# Altium footprint library CommonFootprints_V1.PcbLib: 80 footprints (part 1 of 5)
Each footprint in its own frame and in the unit in brackets; x right, y up, seen from the top. Pads: shape width x height; smd on the part's side, far side on the other; paste and mask are expansions set on the pad; w line width, h text height; cw(c..) or ccw(c..) is an arc to the next point about the centre after c.
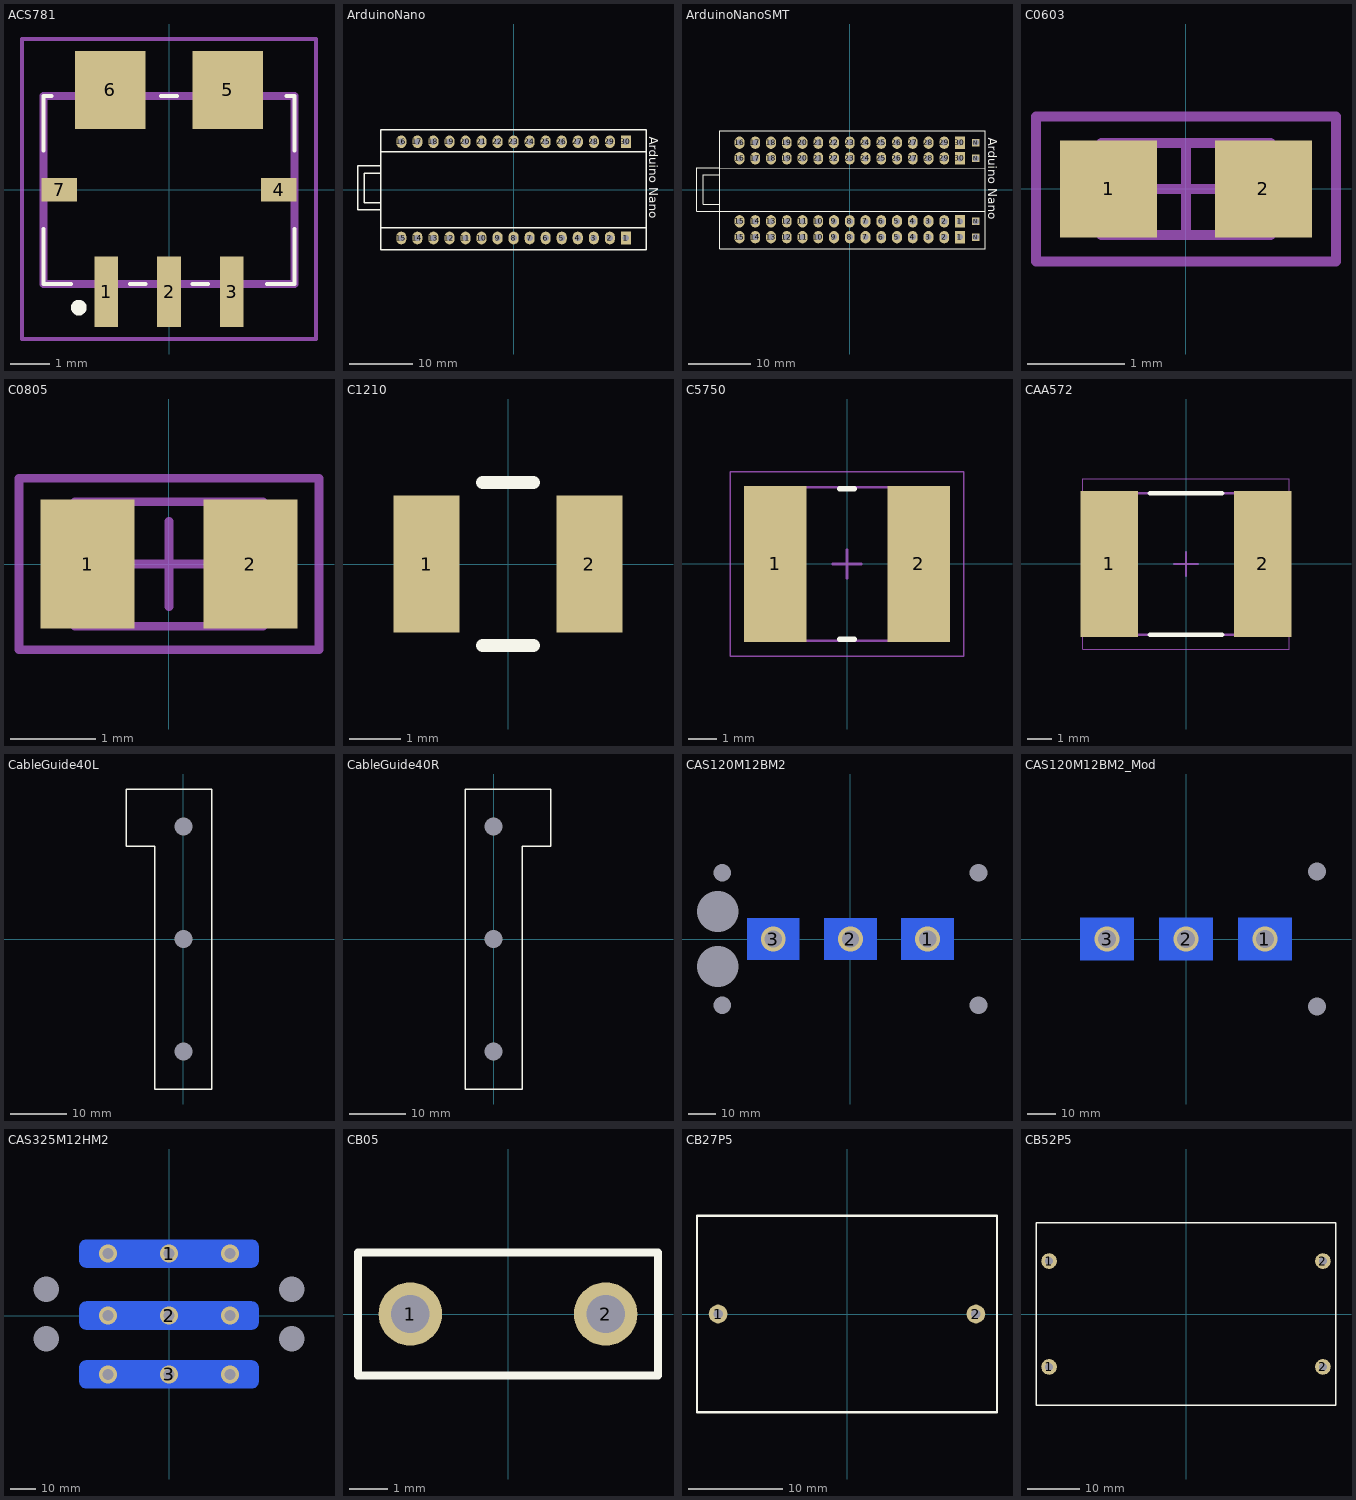
[diagram p0: the footprints below, top view; thin cyan lines are the x and y axes]

## ACS781 [mm]
pads (7):
  rect 0.6x1.8 smd: 1(-1.6,-2.6) 2(0,-2.6) 3(1.6,-2.6)
  rect 0.9x0.6 smd: 4(2.8,0) 7(-2.8,0)
  rect 1.8x2 smd: 5(1.5,2.55) 6(-1.5,2.55)
Top Overlay:
  lines w0.1: -3.2,-1 -3.2,-2.4 -2.5,-2.4 ; -3.2,1 -3.2,2.4 -3,2.4 ; -1,-2.4 -0.6,-2.4 ; -0.2,2.4 0.2,2.4 ; 0.6,-2.4 1,-2.4 ; 2.5,-2.4 3.2,-2.4 3.2,-1 ; 3,2.4 3.2,2.4 3.2,1
  lines w0.2: -2.3,-3.1 ccw(c-2.3,-3) -2.3,-2.9 ccw(c-2.3,-3) -2.3,-3.1
Mechanical 13:
  lines w0.2: -3.2,-2.4 -3.2,2.4 3.2,2.4 3.2,-2.4 -3.2,-2.4
Mechanical 15:
  lines w0.1: -3.75,-3.8 -3.75,3.85 3.75,3.85 3.75,-3.8 -3.75,-3.8
3D body "ACS781LLRTR-050U-T.stp": height 1.6, standoff 0, extent -3.2,-2.4 3.2,2.4

## ArduinoNano [mm]
pads (30):
  rect 1.6x2 hole 1: 1(17.78,-7.62) 30(17.78,7.62)
  oval 1.6x2 hole 1: 2(15.24,-7.62) 3(12.7,-7.62) 4(10.16,-7.62) 5(7.62,-7.62) 6(5.08,-7.62) 7(2.54,-7.62) 8(0,-7.62) 9(-2.54,-7.62) 10(-5.08,-7.62) 11(-7.62,-7.62) 12(-10.16,-7.62) 13(-12.7,-7.62) 14(-15.24,-7.62) 15(-17.78,-7.62) 16(-17.78,7.62) 17(-15.24,7.62) 18(-12.7,7.62) 19(-10.16,7.62) 20(-7.62,7.62) 21(-5.08,7.62) 22(-2.54,7.62) 23(0,7.62) 24(2.54,7.62) 25(5.08,7.62) 26(7.62,7.62) 27(10.16,7.62) 28(12.7,7.62) 29(15.24,7.62)
Top Overlay:
  lines w0.2: -21.082,-3.175 -24.638,-3.175 -24.638,3.81 -21.082,3.81 ; -21.082,-2.032 -23.622,-2.032 -23.622,2.667 -21.082,2.667 ; -21,-6 21,-6 ; -21,6 21,6 ; -21,-9.5 -21,9.5 21,9.5 21,-9.5 -21,-9.5
  text "Arduino Nano" at 21.463,8.382 h1.4

## ArduinoNanoSMT [mm]
pads (64):
  rect 1.6x2 hole 1: 1(17.78,-7.62) 1(17.78,-5.08) 30(17.78,5.08) 30(17.78,7.62)
  oval 1.6x2 hole 1: 2(15.24,-7.62) 2(15.24,-5.08) 3(12.7,-7.62) 3(12.7,-5.08) 4(10.16,-7.62) 4(10.16,-5.08) 5(7.62,-7.62) 5(7.62,-5.08) 6(5.08,-7.62) 6(5.08,-5.08) 7(2.54,-7.62) 7(2.54,-5.08) 8(0,-7.62) 8(0,-5.08) 9(-2.54,-7.62) 9(-2.54,-5.08) 10(-5.08,-7.62) 10(-5.08,-5.08) 11(-7.62,-7.62) 11(-7.62,-5.08) 12(-10.16,-7.62) 12(-10.16,-5.08) 13(-12.7,-7.62) 13(-12.7,-5.08) 14(-15.24,-7.62) 14(-15.24,-5.08) 15(-17.78,-7.62) 15(-17.78,-5.08) 16(-17.78,5.08) 16(-17.78,7.62) 17(-15.24,5.08) 17(-15.24,7.62) 18(-12.7,5.08) 18(-12.7,7.62) 19(-10.16,5.08) 19(-10.16,7.62) 20(-7.62,5.08) 20(-7.62,7.62) 21(-5.08,5.08) 21(-5.08,7.62) 22(-2.54,5.08) 22(-2.54,7.62) 23(0,5.08) 23(0,7.62) 24(2.54,5.08) 24(2.54,7.62) 25(5.08,5.08) 25(5.08,7.62) 26(7.62,5.08) 26(7.62,7.62) 27(10.16,5.08) 27(10.16,7.62) 28(12.7,5.08) 28(12.7,7.62) 29(15.24,5.08) 29(15.24,7.62)
  rect 1.2x1.2 hole 1: N(20.32,-7.62) N(20.32,-5.08) N(20.32,5.08) N(20.32,7.62)
Top Overlay:
  lines w0.2: -21.082,-3.429 -24.638,-3.429 -24.638,3.556 -21.082,3.556 ; -21.082,-2.286 -23.622,-2.286 -23.622,2.413 -21.082,2.413 ; -21,-3.46 21.844,-3.46 ; -21,3.556 21.889,3.46 ; -21,-9.5 21.889,-9.5 21.889,9.5 -21,9.5 -21,-9.5
  text "Arduino Nano" at 22.352,8.382 h1.4
3D body "arduino nano.STEP": height 14.3, standoff -4.3, extent -23.389,-8.89 21.611,9.11

## C0603 [mm]
pads (2):
  rect 1x1 smd: 1(-0.8,0) 2(0.8,0)
Mechanical 13:
  lines w0.1: -0.875,-0.475 0.875,-0.475 0.875,0.475 -0.875,0.475 -0.875,-0.475
Mechanical 15:
  lines w0.1: -0.475,0 0.475,0 ; 0,-0.475 0,0.475 ; -1.55,-0.75 1.55,-0.75 1.55,0.75 -1.55,0.75 -1.55,-0.75
3D body: height 0.85, standoff 0, extent -0.875,-0.475 0.875,0.475

## C0805 [mm]
pads (2):
  rect 1.1x1.5 smd: 1(-0.95,0) 2(0.95,0)
Mechanical 13:
  lines w0.1: -1.1,-0.725 1.1,-0.725 1.1,0.725 -1.1,0.725 -1.1,-0.725
Mechanical 15:
  lines w0.1: -0.5,0 0.5,0 ; 0,-0.5 0,0.5 ; -1.75,-1 1.75,-1 1.75,1 -1.75,1 -1.75,-1
3D body: height 1.1, standoff 0, extent -1.1,-0.725 1.1,0.725

## C1210 [mm]
pads (2):
  rect 1.3x2.7 smd: 1(-1.6,0) 2(1.6,0)
Top Overlay:
  lines w0.254: -0.5,-1.6 0.5,-1.6 ; -0.5,1.6 0.5,1.6
3D body "STL@%STL@%STL@%CAP_3225.stp": height 1.24, standoff 0, extent -1.803,-1.397 1.803,1.397

## C5750 [mm] "C5750 footprint"
height 3.2
pads (2):
  rect 2.2x5.5 smd: 1(-2.525,0) 2(2.525,0)
Top Overlay:
  lines w0.2: -0.25,-2.65 0.25,-2.65 ; -0.25,2.65 0.25,2.65
Mechanical 13:
  lines w0.1: -3.05,-2.7 3.05,-2.7 3.05,2.7 -3.05,2.7 -3.05,-2.7
Mechanical 15:
  lines w0.05: -4.1,-3.25 4.1,-3.25 4.1,3.25 -4.1,3.25 -4.1,-3.25
  lines w0.1: -0.5,0 0.5,0 ; 0,-0.5 0,0.5
3D body: height 3.2, standoff 0, extent 1.55,-2.7 3.05,2.7
3D body: height 3.2, standoff 0, extent -3.05,-2.7 -1.55,2.7
3D body: height 3.2, standoff 0, extent -1.55,-2.7 1.55,2.7

## CAA572 [mm] "Chip Capacitor, 2-Leads, Body 6.25x5.75mm, IPC Low Density"
height 6.7
pads (2):
  rect 2.4x6.1 smd: 1(-3.2,0) 2(3.2,0)
Top Overlay:
  lines w0.2: -1.5,-2.95 1.5,-2.95 ; -1.5,2.95 1.5,2.95
Mechanical 13:
  lines w0.1: -3.2,-2.95 3.2,-2.95 3.2,2.95 -3.2,2.95 -3.2,-2.95
Mechanical 15:
  lines w0.05: -4.3,-3.55 4.3,-3.55 4.3,3.55 -4.3,3.55 -4.3,-3.55
  lines w0.1: -0.5,0 0.5,0 ; 0,-0.5 0,0.5
3D body: height 6.7, standoff 0, extent 1.95,-2.95 3.2,2.95
3D body: height 6.7, standoff 0, extent -3.2,-2.95 -1.95,2.95
3D body: height 6.7, standoff 0, extent -1.95,-2.95 1.95,2.95

## CableGuide40L [mil]
pads (3):
  round 60 hole 125.98: 12(0,-787.4) 13(0,787.4) 14(0,0)
Top Overlay:
  lines w10: -400,650 -400,1050 200,1050 200,-1050 -200,-1050 -200,650 -400,650
3D body: height 393.7, standoff 0, extent -400,-1050 200,1050

## CableGuide40R [mil]
pads (3):
  round 60 hole 125.98: 12(0,-787.4) 13(0,787.4) 14(0,0)
Top Overlay:
  lines w10: -200,-1050 -200,1050 400,1050 400,650 200,650 200,-1050 -200,-1050
3D body: height 393.7, standoff 0, extent -200,-1050 400,1050

## CAS120M12BM2 [mm]
pads (9):
  rect 19x15 smd far side: 1(28,0) 2(0,0) 3(-28,0)
  round 1.524 hole 6.4 unplated: 4(-46.5,-24) 4(-46.5,24) 4(46.5,-24) 4(46.5,24)
  rect 1.524x1.524 hole 15 square unplated: 5(-48.2,-10) 5(-48.2,10)
via 28,0 diameter 9 hole 6.3
via 0,0 diameter 9 hole 6.3
via -28,0 diameter 9 hole 6.3
Bottom Overlay:
  lines w0.254: -53.2,-18 -42.7,-18 -42.7,-2 -53.2,-2 ; -53.2,2 -42.7,2 -42.7,18 -53.2,18 ; -53.2,-30.7 -53.2,30.7 53.2,30.7 53.2,-30.7 -53.2,-30.7
3D body "Semikron SKM SEMITRANS 3.step": height 31.29, standoff 0.79, extent -53.7,-31.285 53.7,31.115

## CAS120M12BM2_Mod [mm]
pads (5):
  rect 19x15 smd far side: 1(28,0) 2(0,0) 3(-28,0)
  round 1.524 hole 6.4 unplated: 4(46.5,-24) 4(46.5,24)
via 28,0 diameter 9 hole 6.3
via 0,0 diameter 9 hole 6.3
via -28,0 diameter 9 hole 6.3
Bottom Overlay:
  lines w0.254: -53.2,-18 -42.7,-18 -42.7,-2 -53.2,-2 ; -53.2,2 -42.7,2 -42.7,18 -53.2,18 ; -53.2,-30.7 -53.2,30.7 53.2,30.7 53.2,-30.7 -53.2,-30.7
3D body "Semikron SKM SEMITRANS 3.step": height 31.29, standoff 0.79, extent -53.7,-31.285 53.7,31.115

## CAS325M12HM2 [mil]
pads (7):
  rrect50% 2755.91x433.07 smd far side: 1(0,952.76) 2(0,0) 3(0,-905.51)
  rect 60x60 hole 393.7 square unplated: 5(-1890,-360) 5(-1890,405) 5(1890,-360) 5(1890,405)
via 937.01,0 diameter 275.59 hole 173.23
via -937.01,0 diameter 275.59 hole 173.23
via 0,0 diameter 275.59 hole 173.23
via 0,952.76 diameter 275.59 hole 173.23
via 937.01,952.76 diameter 275.59 hole 173.23
via 0,-905.51 diameter 275.59 hole 173.23
via 937.01,-905.51 diameter 275.59 hole 173.23
via -937.01,-905.51 diameter 275.59 hole 173.23
via -937.01,952.76 diameter 275.59 hole 173.23
Bottom Overlay:
  circle w10: c1830.71,964.57 r216.54
  circle w10: c1830.71,-925.2 r216.54
  circle w10: c-1830.71,-925.2 r216.54
  circle w10: c-1830.71,964.57 r216.54
  lines w10: -2165.35,-559.06 -1614.17,-559.06 ; -2165.35,-165.35 -1615,-165.35 -1615,-559.06 ; -2165.35,208.66 -1614.17,208.66 -1614.17,602.36 -2165.35,602.36 ; -2045,-925.2 -1614.17,-925.2 ; -2045,964.57 -1614.17,964.57 ; -1830.71,-1140 -1830.71,-710 ; -1830.71,750 -1830.71,1180 ; 1614.17,-925.2 2047.24,-925.2 ; 1614.17,-559.06 2165.35,-559.06 ; 1615,-559.06 1615,-165.35 2165.35,-165.35 ; 1615,964.57 2047.24,964.57 ; 1830.71,-1139.29 1830.71,-710 ; 1830.71,750 1830.71,1180 ; 2165.35,208.66 1614.17,208.66 1614.17,602.36 2165.35,602.36 ; -2165.35,-1259.84 2165.35,-1259.84 2165.35,1299.21 -2165.35,1299.21 -2165.35,-1259.84
  text "-" at 1395,-965.51 h118.11
  text "+" at 1400,885 h118.11
  text "~" at 1410,-130 h118.11
Mechanical 1:
  pour cut-out: 1370,35
3D body "CREE CAS325M12HM2-1.stp": height 417.32, standoff -244.09, extent -2165.35,-1259.84 2165.36,1299.22

## CB05 [mm]
pads (2):
  round 1.65 hole 1: 1(-2.54,0) 2(2.54,0)
Top Overlay:
  lines w0.2: -3.9,-1.6 3.9,-1.6 3.9,1.6 -3.9,1.6 -3.9,-1.6

## CB27P5 [mm]
pads (2):
  round 2 hole 1: 1(-13.75,0) 2(13.75,0)
Top Overlay:
  lines w0.254: -16,-10.5 -16,10.5 16,10.5 16,-10.5 -16,-10.5
3D body: height 31, standoff 0, extent -16,-10.5 16,10.5

## CB52P5 [mm]
pads (4):
  round 3 hole 1.5: 1(-26.25,-10.15) 1(-26.25,10.15) 2(26.25,-10.15) 2(26.25,10.15)
Top Overlay:
  lines w0.254: -28.75,-17.5 -28.75,17.5 28.75,17.5 28.75,-17.5 -28.75,-17.5
3D body: height 50, standoff 0, extent -28.75,-17.5 28.75,17.5